# Altium footprint library Main_MCU_2020-08-18_21-02-23.PcbLib: 24 footprints (part 2 of 2)
Each footprint in its own frame and in the unit in brackets; x right, y up, seen from the top. Pads: shape width x height; smd on the part's side, far side on the other; paste and mask are expansions set on the pad; w line width, h text height; cw(c..) or ccw(c..) is an arc to the next point about the centre after c.
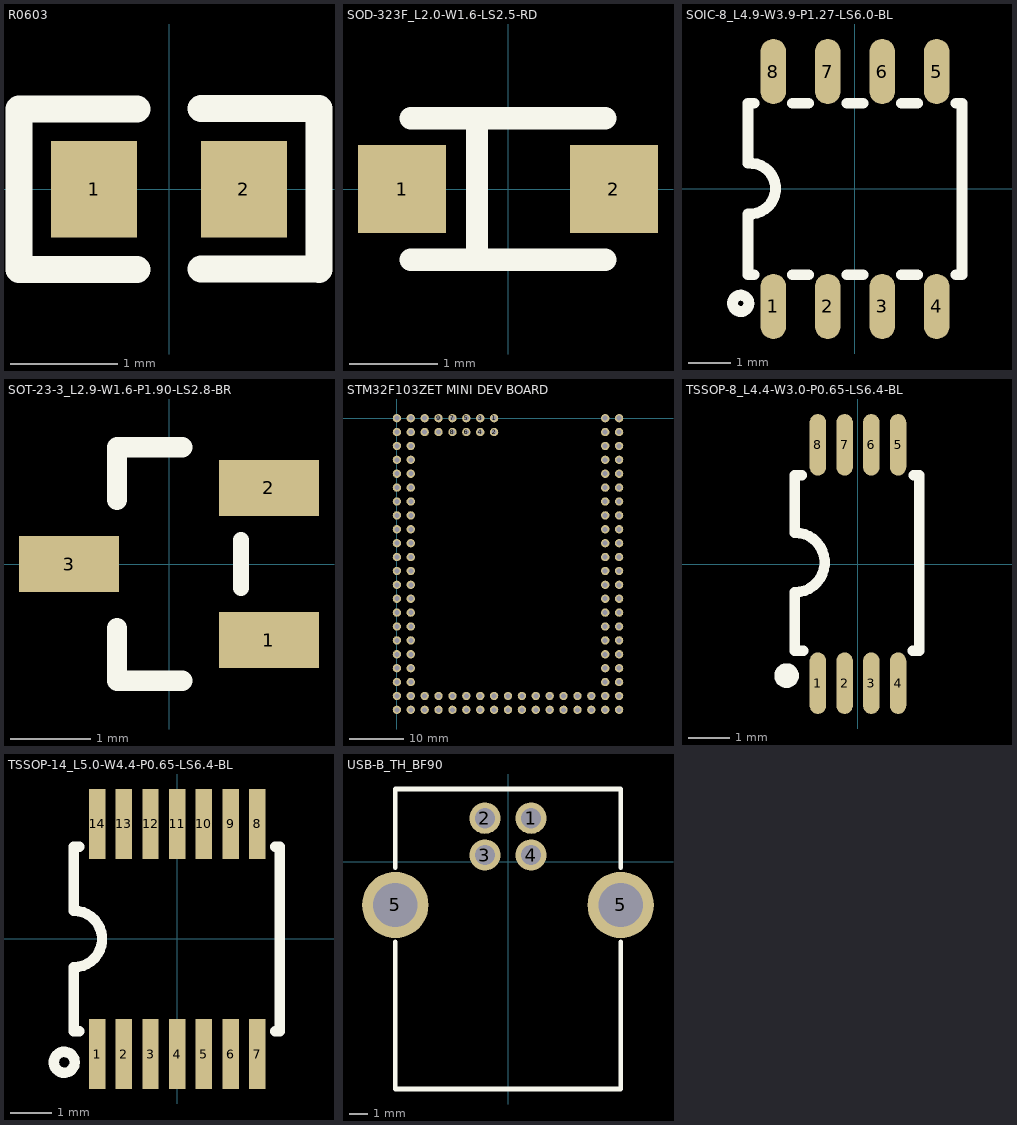
[diagram p1: the footprints below, top view; thin cyan lines are the x and y axes]

## R0603 [mm]
pads (2):
  rect 0.8x0.9 smd: 1(-0.7,0) 2(0.7,0)
Top Overlay:
  lines w0.254: -1.401,-0.75 -0.3,-0.75 ; -1.401,0.75 -0.3,0.75 ; -1.4,-0.75 -1.4,0.75 ; 0.301,-0.745 1.401,-0.745 ; 0.301,0.755 1.401,0.755 ; 1.401,-0.75 1.401,0.75
3D body "User Library-RES_1609-0603.step": height 0.56, standoff 0, extent -0.85,-0.4 0.85,0.4

## SOD-323F_L2.0-W1.6-LS2.5-RD [mm]
pads (2):
  rect 1x1 smd: 1(-1.2,0) 2(1.2,0)
Top Overlay:
  lines w0.254: -1.1,-0.8 1.1,-0.8 ; -1.1,0.8 1.1,0.8 ; -0.351,-0.8 -0.351,0.8
3D body "D_SOD-323.step": height 1.1, standoff 0, extent -1.25,-0.625 1.25,0.625

## SOIC-8_L4.9-W3.9-P1.27-LS6.0-BL [mm]
pads (8):
  oval 0.6x1.518 smd: 1(-1.905,-2.74) 2(-0.635,-2.74) 3(0.635,-2.74) 4(1.905,-2.74) 5(1.905,2.74) 6(0.635,2.74) 7(-0.635,2.74) 8(-1.905,2.74)
Top Overlay:
  circle w0.254: c-2.667,-2.667 r0.191
  lines w0.254: -2.5,-0.58 -2.5,-2 -2.356,-2 ; -2.5,0.6 -2.5,2 -2.356,2 ; -2.49,-0.58 ccw(c-2.445,0.01) -2.49,0.6 ; -1.454,-2 -1.086,-2 ; -1.454,2 -1.086,2 ; -0.184,-2 0.184,-2 ; -0.184,2 0.184,2 ; 1.086,-2 1.454,-2 ; 1.086,2 1.454,2 ; 2.356,-2 2.5,-2 2.5,2 2.356,2
3D body "SO-8.step": height 1.88, standoff -0.03, extent -2.5,-3.169 2.504,3.169

## SOT-23-3_L2.9-W1.6-P1.90-LS2.8-BR [mm]
pads (3):
  rect 1.25x0.7 smd: 1(1.25,-0.95) 2(1.25,0.95) 3(-1.25,0)
Top Overlay:
  lines w0.2: 0.9,-0.3 0.9,0.3
  lines w0.254: -0.65,-0.8 -0.65,-1.46 0.165,-1.46 ; 0.165,1.46 -0.65,1.46 ; -0.65,0.8 -0.65,1.46 ; -0.65,0.8 -0.65,1.46 ; -0.65,0.8 -0.65,1.46
3D body "User Library-SOT-23-4.step": height 1.02, standoff -0.05, extent -1.113,-1.475 1.27,1.475

## STM32F103ZET MINI DEV BOARD [mil]
pads (126):
  round 60 hole 36: 1(700,0) 2(700,-100) 3(600,0) 4(600,-100) 5(500,0) 6(500,-100) 7(400,0) 8(400,-100) 9(300,0) 10(300,-100) 11(200,0) 12(200,-100) 13(0,0) 14(100,0) 15(0,-100) 16(100,-100) 17(0,-200) 18(100,-200) 19(0,-300) 20(100,-300) 21(0,-400) 22(100,-400) 23(0,-500) 24(100,-500) 25(0,-600) 26(100,-600) 27(0,-700) 28(100,-700) 29(0,-800) 30(100,-800) 31(0,-900) 32(100,-900) 33(0,-1000) 34(100,-1000) 35(0,-1100) 36(100,-1100) 37(0,-1200) 38(100,-1200) 39(0,-1300) 40(100,-1300) 41(0,-1400) 42(100,-1400) 43(0,-1500) 44(100,-1500) 45(0,-1600) 46(100,-1600) 47(0,-1700) 48(100,-1700) 49(0,-1800) 50(100,-1800) 51(0,-1900) 52(100,-1900) 53(0,-2000) 54(100,-2000) 55(0,-2100) 56(100,-2100) 57(200,-2100) 58(200,-2000) 59(300,-2100) 60(300,-2000) 61(400,-2100) 62(400,-2000) 63(500,-2100) 64(500,-2000) 65(600,-2100) 66(600,-2000) 67(700,-2100) 68(700,-2000) 69(800,-2100) 70(800,-2000) 71(900,-2100) 72(900,-2000) 73(1000,-2100) 74(1000,-2000) 75(1100,-2100) 76(1100,-2000) 77(1200,-2100) 78(1200,-2000) 79(1300,-2100) 80(1300,-2000) 81(1400,-2100) 82(1400,-2000) 83(1600,-2100) 84(1500,-2100) 85(1600,-2000) 86(1500,-2000) 87(1600,-1900) 88(1500,-1900) 89(1600,-1800) 90(1500,-1800) 91(1600,-1700) 92(1500,-1700) 93(1600,-1600) 94(1500,-1600) 95(1600,-1500) 96(1500,-1500) 97(1600,-1400) 98(1500,-1400) 99(1600,-1300) 100(1500,-1300) 101(1600,-1200) 102(1500,-1200) 103(1600,-1100) 104(1500,-1100) 105(1600,-1000) 106(1500,-1000) 107(1600,-900) 108(1500,-900) 109(1600,-800) 110(1500,-800) 111(1600,-700) 112(1500,-700) 113(1600,-600) 114(1500,-600) 115(1600,-500) 116(1500,-500) 117(1600,-400) 118(1500,-400) 119(1600,-300) 120(1500,-300) 121(1600,-200) 122(1500,-200) 123(1600,-100) 124(1500,-100) 125(1600,0) 126(1500,0)
3D body "PinSocket_2x06_P2.54mm_Vertical.step": height 102.36, standoff -295.28, extent 150,-149.99 750,50.01
3D body "PinSocket_2x13_P2.54mm_Vertical.step": height 102.36, standoff -295.28, extent 150,-2150 1450,-1950
3D body "PinSocket_2x22_P2.54mm_Vertical.step": height 102.36, standoff -295.28, extent -50,-2150 150,50
3D body "PinSocket_2x22_P2.54mm_Vertical.step": height 275.59, standoff -122.05, extent 1450,-2150 1650,50
3D body "PinHeader_2x06_P2.54mm_Vertical.step": height 492.13, standoff 37.8, extent 150,-150 750,50
3D body "stmzet.x_t": height 669.29, standoff 259.84, extent -125,-2225.17 1725,185.17
3D body "aaaaa.x_t": height 394.29, standoff 378.88, extent -29.54,-2129.69 1629.47,29.36
3D body "PinHeader_2x22_P2.54mm_Vertical.step": height 492.13, standoff 37.8, extent -50,-2150 150,50
3D body "PinHeader_2x22_P2.54mm_Vertical.step": height 492.13, standoff 37.8, extent 1450,-2150 1650,50
3D body "PinHeader_2x13_P2.54mm_Vertical.step": height 492.13, standoff 37.8, extent 150.01,-2150 1450.01,-1950

## TSSOP-8_L4.4-W3.0-P0.65-LS6.4-BL [mm]
pads (8):
  oval 0.4x1.497 smd: 1(-0.975,-2.9) 2(-0.325,-2.9) 3(0.325,-2.9) 4(0.975,-2.9) 5(0.975,2.9) 6(0.325,2.9) 7(-0.325,2.9) 8(-0.975,2.9)
Top Overlay:
  lines w0.254: -1.534,-2.108 -1.534,-0.711 ; -1.534,-0.686 ccw(c-1.534,0.038) -1.534,0.762 -1.534,2.159 -1.362,2.159 ; -1.509,-2.108 -1.332,-2.108 ; 1.332,-2.108 1.488,-2.108 1.488,2.159 1.362,2.159
  lines w0.3: -1.737,-2.565 ccw(c-1.736,-2.715) -1.735,-2.565
3D body "TSSOP-8_4.4x3mm_P0.65mm.step": height 1.1, standoff 0, extent -1.5,-3.2 1.5,3.2

## TSSOP-14_L5.0-W4.4-P0.65-LS6.4-BL [mm]
pads (14):
  rect 0.4x1.7 smd: 1(-1.95,-2.8) 2(-1.3,-2.8) 3(-0.65,-2.8) 4(0,-2.8) 5(0.65,-2.8) 6(1.3,-2.8) 7(1.95,-2.8) 8(1.95,2.8) 9(1.3,2.8) 10(0.65,2.8) 11(0,2.8) 12(-0.65,2.8) 13(-1.3,2.8) 14(-1.95,2.8)
Top Overlay:
  circle w0.254: c-2.75,-3 r0.254
  lines w0.254: -2.515,-2.25 -2.515,-1.6 -2.515,-0.686 ccw(c-2.515,0) -2.515,0.686 -2.515,1.6 -2.515,2.25 ; -2.5,-2.25 -2.384,-2.25 ; -2.5,2.25 -2.384,2.25 ; 2.384,-2.25 2.5,-2.25 2.5,2.25 2.384,2.25
3D body "TSSOP-14_4.4x5mm_P0.65mm.step": height 1, standoff 0, extent -2.5,-3.2 2.5,3.2

## USB-B_TH_BF90 [mm]
pads (6):
  round 1.7 hole 1.1: 1(1.25,2.355) 2(-1.25,2.355) 3(-1.25,0.355) 4(1.25,0.355)
  round 3.6 hole 2.4: 5(-6.116,-2.355) 5(6.116,-2.355)
Top Overlay:
  lines w0.254: -6.116,-4.354 -6.116,-12.343 6.116,-12.343 ; -6.116,-0.336 -6.116,3.941 ; 6.116,-12.341 6.116,-4.354 ; 6.116,-0.336 6.116,3.941
  lines w0.258: -6.116,-12.343 6.116,-12.343 ; -6.116,3.941 6.116,3.941
3D body "USB-B1HSB6--3DModel-STEP-56544.STEP": height 10.9, standoff -3.6, extent -7.42,-12.695 7.42,3.805